# Altium footprint library PcbLib1.PcbLib: 38 footprints (part 3 of 3)
Each footprint in its own frame and in the unit in brackets; x right, y up, seen from the top. Pads: shape width x height; smd on the part's side, far side on the other; paste and mask are expansions set on the pad; w line width, h text height; cw(c..) or ccw(c..) is an arc to the next point about the centre after c.
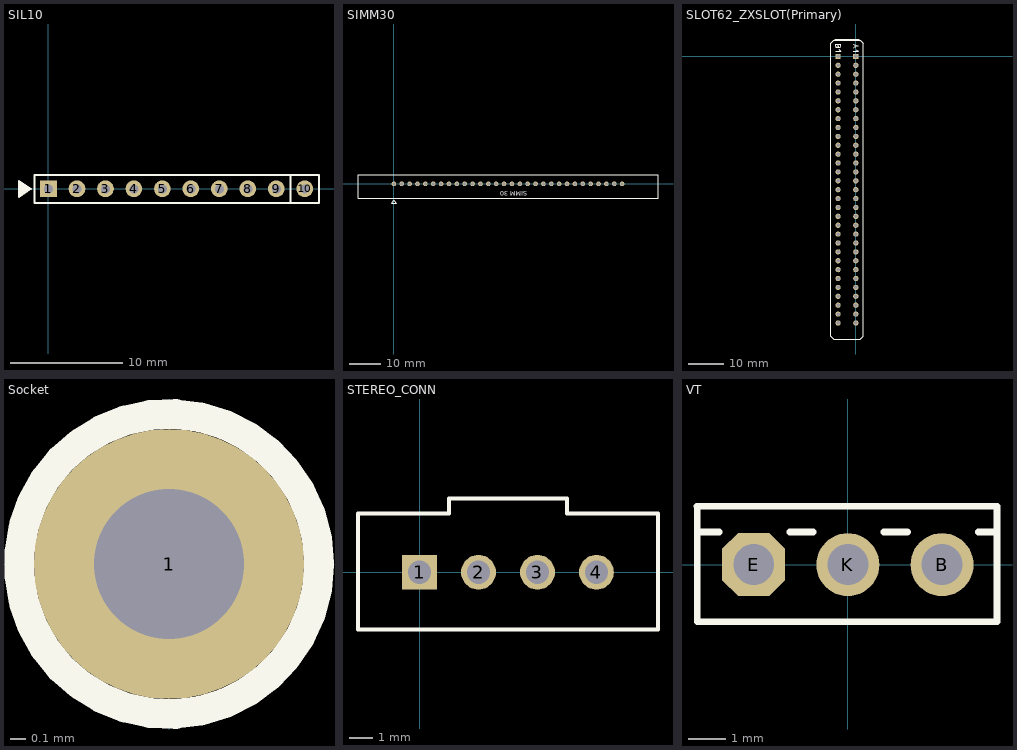
[diagram p2: the footprints below, top view; thin cyan lines are the x and y axes]

## SIL10 [mm]
pads (10):
  rect 1.5x1.5 hole 0.8: 1(0,0)
  round 1.5 hole 0.8: 2(2.54,0) 3(5.08,0) 4(7.62,0) 5(10.16,0) 6(12.7,0) 7(15.244,0) 8(17.78,0) 9(20.32,0) 10(22.86,0)
Top Overlay:
  region: -2.631,0.696 -2.631,-0.724 -1.571,-0.004
  lines w0.178: 21.603,-1.246 21.603,1.214 ; -2.631,-0.724 -2.631,0.696 -1.571,-0.004 -2.631,-0.724 ; -1.269,-1.286 24.132,-1.286 24.132,1.254 15.718,1.254 -1.269,1.254 -1.269,-1.286

## SIMM30 [mm]
pads (30):
  round 1.5 hole 1: 1(0,0) 2(2.54,0) 3(5.08,0) 4(7.62,0) 5(10.16,0) 6(12.7,0) 7(15.24,0) 8(17.78,0) 9(20.32,0) 10(22.86,0) 11(25.4,0) 12(27.94,0) 13(30.48,0) 14(33.02,0) 15(35.56,0) 16(38.1,0) 17(40.64,0) 18(43.18,0) 19(45.72,0) 20(48.26,0) 21(50.8,0) 22(53.34,0) 23(55.88,0) 24(58.42,0) 25(60.96,0) 26(63.5,0) 27(66.04,0) 28(68.58,0) 29(71.12,0) 30(73.66,0)
Top Overlay:
  lines w0.178: -11.57,-4.579 -11.57,3.021 85.23,3.021 85.23,-4.579 -11.57,-4.579 ; -0.701,-6.316 0.009,-5.266 0.719,-6.316 -0.701,-6.316
  text "SIMM 30" at 43.069,-2.336 h1.5

## SLOT62_ZXSLOT(Primary) [mm]
pads (62):
  rect 1.5x1.5 hole 1: A1(0,0) B1(-5.08,0)
  round 1.5 hole 1: A2(0,-2.54) A3(0,-5.08) A4(0,-7.62) A5(0,-10.16) A6(0,-12.7) A7(0,-15.24) A8(0,-17.78) A9(0,-20.32) A10(0,-22.86) A11(0,-25.4) A12(0,-27.94) A13(0,-30.48) A14(0,-33.02) A15(0,-35.56) A16(0,-38.1) A17(0,-40.64) A18(0,-43.18) A19(0,-45.72) A20(0,-48.26) A21(0,-50.8) A22(0,-53.34) A23(0,-55.88) A24(0,-58.42) A25(0,-60.96) A26(0,-63.5) A27(0,-66.04) A28(0,-68.58) A29(0,-71.12) A30(0,-73.66) A31(0,-76.2) B2(-5.08,-2.54) B3(-5.08,-5.08) B4(-5.08,-7.62) B5(-5.08,-10.16) B6(-5.08,-12.7) B7(-5.08,-15.24) B8(-5.08,-17.78) B9(-5.08,-20.32) B10(-5.08,-22.86) B11(-5.08,-25.4) B12(-5.08,-27.94) B13(-5.08,-30.48) B14(-5.08,-33.02) B15(-5.08,-35.56) B16(-5.08,-38.1) B17(-5.08,-40.64) B18(-5.08,-43.18) B19(-5.08,-45.72) B20(-5.08,-48.26) B21(-5.08,-50.8) B22(-5.08,-53.34) B23(-5.08,-55.88) B24(-5.08,-58.42) B25(-5.08,-60.96) B26(-5.08,-63.5) B27(-5.08,-66.04) B28(-5.08,-68.58) B29(-5.08,-71.12) B30(-5.08,-73.66) B31(-5.08,-76.2)
Top Overlay:
  lines w0.178: -7.107,-80.019 -7.107,3.801 -6.337,4.571 1.283,4.571 2.053,3.801 2.053,-80.019 1.283,-80.789 -6.337,-80.789 -7.107,-80.019
  lines w0.229: -5.787,1.543 -4.364,1.543 -4.898,2.076 ; -5.076,3.426 -5.076,2.893 ; -0.707,1.433 0.716,1.433 0.182,1.966 ; -0.707,2.47 0.716,3.003 -0.707,3.536 ; -0.173,2.683 -0.173,3.323 ; -5.076,2.893 -4.987,2.68 -4.809,2.573 -4.631,2.573 -4.453,2.68 -4.364,2.893 -4.364,3.426 -5.787,3.426 -5.787,2.893 -5.698,2.68 -5.52,2.573 -5.342,2.573 -5.164,2.68 -5.076,2.893
  lines w0.356: -6.099,4.984 1.045,4.984
3D body "5176138-2--3DModel-STEP-1.STEP": height 15.13, standoff -3.67, extent -7.287,-80.8 2.187,4.544

## Socket [mm]
pads (1):
  round 1.8 hole 1: 1(0,0)
Top Overlay:
  circle w0.2: c0,0 r1
  text ".Comment" at -8.832,-0.55 h1.1

## STEREO_CONN [mm]
pads (4):
  rect 1.5x1.5 hole 1: 1(0,0)
  round 1.5 hole 1: 2(2.54,0) 3(5.08,0) 4(7.62,0)
Top Overlay:
  lines w0.178: -2.65,-2.46 10.27,-2.46 10.27,2.54 6.35,2.54 6.35,3.175 1.27,3.175 1.27,2.54 -2.65,2.54 -2.65,-2.46

## VT [mm]
pads (3):
  round 1.7 hole 1.1: B(2.54,0) K(0,0)
  oct 1.7x1.7 hole 1.1: E(-2.54,0)
Top Overlay:
  lines w0.178: -4.069,1.575 4.022,1.575 4.022,-1.542 -4.063,-1.542 -4.063,1.575 -3.91,1.575 ; -4.028,0.88 -3.472,0.88 ; -1.567,0.88 -0.932,0.88 ; 0.973,0.88 1.608,0.88 ; 3.513,0.88 3.989,0.88
3D body "User Library-KT315 and KT361 short.STEP": height 5.67, standoff -1.31, extent -3.59,-1.379 3.61,1.621